# Altium footprint library Resistors_SMD_IPC-SM-782.PcbLib: 200 footprints (part 6 of 13)
Each footprint in its own frame and in the unit in brackets; x right, y up, seen from the top. Pads: shape width x height; smd on the part's side, far side on the other; paste and mask are expansions set on the pad; w line width, h text height; cw(c..) or ccw(c..) is an arc to the next point about the centre after c.
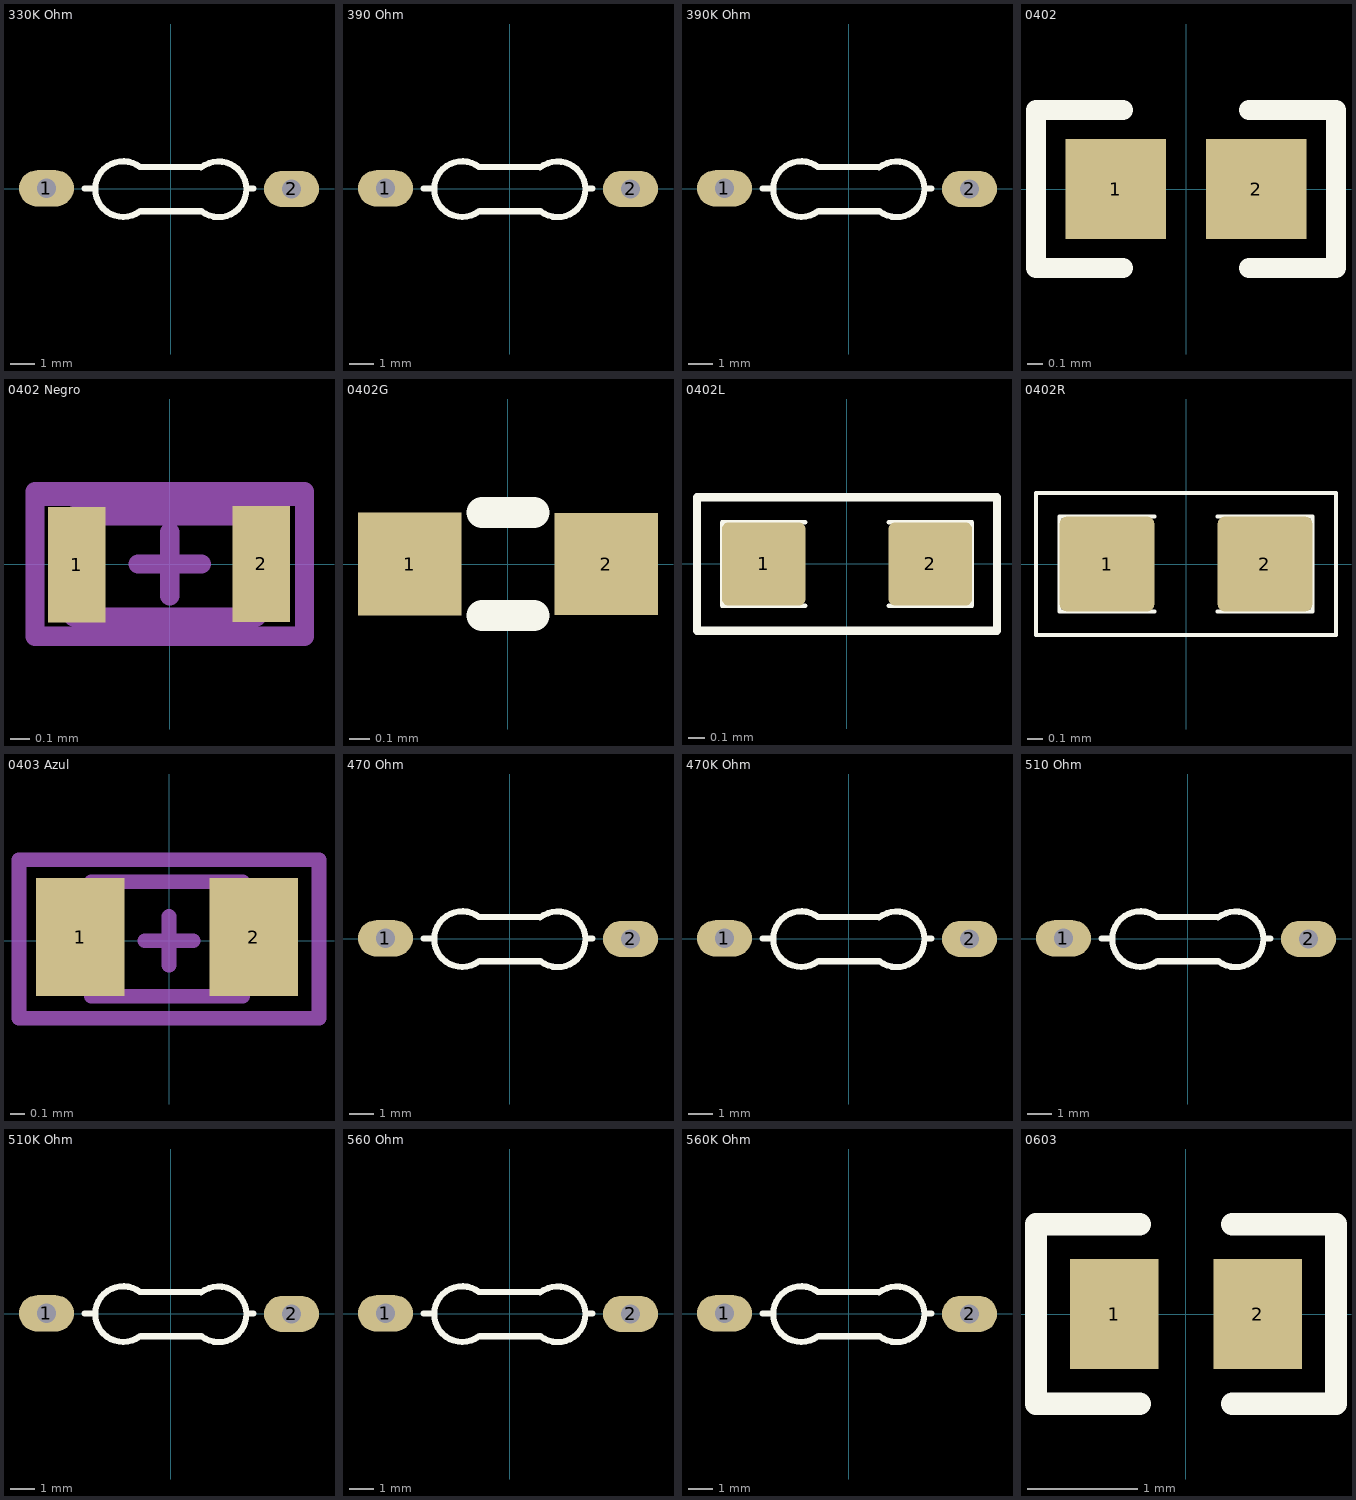
[diagram p5: the footprints below, top view; thin cyan lines are the x and y axes]

## 330K Ohm [mm] "RESISTENCIA DE 1/4 W DE 330K OHM"
pads (2):
  oval 2.27x1.5 hole 0.8: 1(-5.125,0.025) 2(5,0)
Top Overlay:
  lines w0.254: -3.55,0.025 -3.225,0.025 ; -1.269,-0.925 cw(c-1.959,-0.005) -1.25,0.9 ; -1.248,0.9 1.25,0.9 ; -1.245,-0.925 1.286,-0.925 ; 1.265,0.881 cw(c1.985,-0.015) 1.286,-0.928 ; 3.15,0.025 3.425,0.025
3D body "SW3dPS-RESISTOR, 0.25 W, 0.4 IN LEAD PITCH.STEP": height 1.16, standoff -1.16, extent -5.56,-2.349 5.21,3.125
3D body "Res 330K.STEP": height 2.93, standoff -0.91, extent -5.385,-1.168 5.385,1.143

## 390 Ohm [mm] "RESISTENCIA DE 1/4 W DE 390 OHM"
pads (2):
  oval 2.27x1.5 hole 0.8: 1(-5.125,0.025) 2(5,0)
Top Overlay:
  lines w0.254: -3.55,0.025 -3.225,0.025 ; -1.269,-0.925 cw(c-1.959,-0.005) -1.25,0.9 ; -1.248,0.9 1.25,0.9 ; -1.245,-0.925 1.286,-0.925 ; 1.265,0.881 cw(c1.985,-0.015) 1.286,-0.928 ; 3.15,0.025 3.425,0.025
3D body "SW3dPS-RESISTOR, 0.25 W, 0.4 IN LEAD PITCH.STEP": height 1.16, standoff -1.16, extent -5.56,-2.349 5.21,3.125
3D body "Res 390.STEP": height 2.93, standoff -0.91, extent -5.385,-1.168 5.385,1.143

## 390K Ohm [mm] "RESISTENCIA DE 1/4 W DE 390K OHM"
pads (2):
  oval 2.27x1.5 hole 0.8: 1(-5.125,0.025) 2(5,0)
Top Overlay:
  lines w0.254: -3.55,0.025 -3.225,0.025 ; -1.269,-0.925 cw(c-1.959,-0.005) -1.25,0.9 ; -1.248,0.9 1.25,0.9 ; -1.245,-0.925 1.286,-0.925 ; 1.265,0.881 cw(c1.985,-0.015) 1.286,-0.928 ; 3.15,0.025 3.425,0.025
3D body "SW3dPS-RESISTOR, 0.25 W, 0.4 IN LEAD PITCH.STEP": height 1.16, standoff -1.16, extent -5.56,-2.349 5.21,3.125
3D body "Res 390K.STEP": height 2.93, standoff -0.91, extent -5.385,-1.168 5.385,1.143

## 0402 [mil]
pads (2):
  rect 25x25 smd: 1(-17.5,0) 2(17.5,0)
Top Overlay:
  lines w5: -37.4,-19.68 -15.75,-19.68 ; -37.4,-18.7 -37.4,19.68 -15.75,19.68 ; 15.75,-19.68 37.4,-19.68 37.4,18.7 ; 15.75,19.68 37.4,19.68

## 0402 Negro [mm] "Chip Resistor, Empaque 0402"
height 0.3
pads (2):
  rect 0.3x0.6 smd: 1(-0.483,-0.004) 2(0.475,0)
Mechanical 13:
  lines w0.1: -0.5,-0.275 -0.5,0.25 0.45,0.25 0.45,-0.275 -0.5,-0.275
Mechanical 15:
  lines w0.1: -0.7,0.35 0.7,0.35 ; -0.165,0 0.165,0 ; 0,-0.165 0,0.165 ; -0.7,-0.375 -0.7,0.375 0.7,0.375 0.7,-0.375 -0.7,-0.375
3D body "0402 SMD Resistor.STEP": height 0.2, standoff 0, extent -0.508,-0.304 0.492,0.296

## 0402G [mil] "GEO case"
pads (2):
  rect 20x20 smd: 1(-19,0)
  rect 20x19.68 smd: 2(19,0)
Top Overlay:
  lines w6: -5,-10 5,-10 ; -5,10 5,10
3D body "User Library-CR1005-0402.step": height 13.78, standoff 0, extent -19.68,-9.85 19.68,9.84

## 0402L [mm]
pads (2):
  rrect15% 0.5x0.5 smd: 1(-0.5,0) 2(0.5,0)
Top Overlay:
  lines w0.025: -0.25,-0.25 -0.75,-0.25 -0.75,0.25 -0.25,0.25 ; 0.25,-0.25 0.75,-0.25 0.75,0.25 0.25,0.25
  lines w0.05: -0.9,-0.4 -0.9,0.4 0.9,0.4 0.9,-0.4 -0.9,-0.4
3D body "SW3dPS-d0402h025.STEP": height 0.25, standoff 0, extent -0.5,-0.25 0.5,0.25

## 0402R [mm]
pads (2):
  rrect15% 0.6x0.6 smd: 1(-0.5,0) 2(0.5,0)
Top Overlay:
  lines w0.025: -0.2,-0.3 -0.8,-0.3 -0.8,0.3 -0.2,0.3 ; 0.2,-0.3 0.8,-0.3 0.8,0.3 0.2,0.3 ; -0.95,-0.45 -0.95,0.45 0.95,0.45 0.95,-0.45 -0.95,-0.45
3D body "User Library-RES_1005-0402.STEP": height 0.41, standoff 0, extent -0.575,-0.275 0.575,0.275

## 0403 Azul [mm] "Chip Resistor, Empaque 0403"
height 0.3
pads (2):
  rect 0.6x0.8 smd: 1(-0.6,0.025) 2(0.575,0.025)
Mechanical 13:
  lines w0.1: -0.525,-0.375 -0.525,0.4 0.5,0.4 0.5,-0.375 -0.525,-0.375
Mechanical 15:
  lines w0.1: -0.165,0 0.165,0 ; 0,-0.165 0,0.165 ; -1.016,-0.525 -1.016,0.55 1.016,0.55 1.016,-0.525 -1.016,-0.525
3D body "0403.STEP": height 0.85, standoff -0.01, extent -0.525,-0.425 0.491,0.439
3D body "0403.STEP": height 0.73, standoff -0.13, extent -0.525,-0.407 0.491,0.457

## 470 Ohm [mm] "RESISTENCIA DE 1/4 W DE 470 OHM"
pads (2):
  oval 2.27x1.5 hole 0.8: 1(-5.125,0.025) 2(5,0)
Top Overlay:
  lines w0.254: -3.55,0.025 -3.225,0.025 ; -1.269,-0.925 cw(c-1.959,-0.005) -1.25,0.9 ; -1.248,0.9 1.25,0.9 ; -1.245,-0.925 1.286,-0.925 ; 1.265,0.881 cw(c1.985,-0.015) 1.286,-0.928 ; 3.15,0.025 3.425,0.025
3D body "SW3dPS-RESISTOR, 0.25 W, 0.4 IN LEAD PITCH.STEP": height 1.16, standoff -1.16, extent -5.56,-2.349 5.21,3.125
3D body "Res 470.STEP": height 2.93, standoff -0.91, extent -5.385,-1.168 5.385,1.143

## 470K Ohm [mm] "RESISTENCIA DE 1/4 W DE 470K OHM"
pads (2):
  oval 2.27x1.5 hole 0.8: 1(-5.125,0.025) 2(5,0)
Top Overlay:
  lines w0.254: -3.55,0.025 -3.225,0.025 ; -1.269,-0.925 cw(c-1.959,-0.005) -1.25,0.9 ; -1.248,0.9 1.25,0.9 ; -1.245,-0.925 1.286,-0.925 ; 1.265,0.881 cw(c1.985,-0.015) 1.286,-0.928 ; 3.15,0.025 3.425,0.025
3D body "Res 470K.STEP": height 2.93, standoff -0.91, extent -5.385,-1.168 5.385,1.143
3D body "SW3dPS-RESISTOR, 0.25 W, 0.4 IN LEAD PITCH.STEP": height 1.16, standoff -1.16, extent -5.56,-2.349 5.21,3.125

## 510 Ohm [mm] "RESISTENCIA DE 1/4 W DE 510 OHM"
pads (2):
  oval 2.27x1.5 hole 0.8: 1(-5.125,0.025) 2(5,0)
Top Overlay:
  lines w0.254: -3.55,0.025 -3.225,0.025 ; -1.269,-0.925 cw(c-1.959,-0.005) -1.25,0.9 ; -1.248,0.9 1.25,0.9 ; -1.245,-0.925 1.286,-0.925 ; 1.265,0.881 cw(c1.985,-0.015) 1.286,-0.928 ; 3.15,0.025 3.425,0.025
3D body "SW3dPS-RESISTOR, 0.25 W, 0.4 IN LEAD PITCH.STEP": height 1.16, standoff -1.16, extent -5.56,-2.349 5.21,3.125
3D body "Res 510.STEP": height 2.93, standoff -0.91, extent -5.385,-1.168 5.385,1.143

## 510K Ohm [mm] "RESISTENCIA DE 1/4 W DE 510K OHM"
pads (2):
  oval 2.27x1.5 hole 0.8: 1(-5.125,0.025) 2(5,0)
Top Overlay:
  lines w0.254: -3.55,0.025 -3.225,0.025 ; -1.269,-0.925 cw(c-1.959,-0.005) -1.25,0.9 ; -1.248,0.9 1.25,0.9 ; -1.245,-0.925 1.286,-0.925 ; 1.265,0.881 cw(c1.985,-0.015) 1.286,-0.928 ; 3.15,0.025 3.425,0.025
3D body "Res 510K.STEP": height 2.93, standoff -0.91, extent -5.385,-1.168 5.385,1.143
3D body "SW3dPS-RESISTOR, 0.25 W, 0.4 IN LEAD PITCH.STEP": height 1.16, standoff -1.16, extent -5.56,-2.349 5.21,3.125

## 560 Ohm [mm] "RESISTENCIA DE 1/4 W DE 560K OHM"
pads (2):
  oval 2.27x1.5 hole 0.8: 1(-5.125,0.025) 2(5,0)
Top Overlay:
  lines w0.254: -3.55,0.025 -3.225,0.025 ; -1.269,-0.925 cw(c-1.959,-0.005) -1.25,0.9 ; -1.248,0.9 1.25,0.9 ; -1.245,-0.925 1.286,-0.925 ; 1.265,0.881 cw(c1.985,-0.015) 1.286,-0.928 ; 3.15,0.025 3.425,0.025
3D body "SW3dPS-RESISTOR, 0.25 W, 0.4 IN LEAD PITCH.STEP": height 1.16, standoff -1.16, extent -5.56,-2.349 5.21,3.125
3D body "Res 560.STEP": height 2.93, standoff -0.91, extent -5.385,-1.168 5.385,1.143

## 560K Ohm [mm] "RESISTENCIA DE 1/4 W DE 560K OHM"
pads (2):
  oval 2.27x1.5 hole 0.8: 1(-5.125,0.025) 2(5,0)
Top Overlay:
  lines w0.254: -3.55,0.025 -3.225,0.025 ; -1.269,-0.925 cw(c-1.959,-0.005) -1.25,0.9 ; -1.248,0.9 1.25,0.9 ; -1.245,-0.925 1.286,-0.925 ; 1.265,0.881 cw(c1.985,-0.015) 1.286,-0.928 ; 3.15,0.025 3.425,0.025
3D body "SW3dPS-RESISTOR, 0.25 W, 0.4 IN LEAD PITCH.STEP": height 1.16, standoff -1.16, extent -5.56,-2.349 5.21,3.125
3D body "Res 560K.STEP": height 2.93, standoff -0.91, extent -5.385,-1.168 5.385,1.143

## 0603 [mm]
pads (2):
  rect 0.8x1 smd: 1(-0.649,0) 2(0.649,0)
Top Overlay:
  lines w0.203: -0.418,-0.813 -1.358,-0.813 -1.358,0.813 -0.418,0.813 ; 0.418,-0.813 1.358,-0.813 1.358,0.813 0.418,0.813
3D body "SW3dPS-R0603.step": height 0.37, standoff 0, extent -0.8,-0.406 0.8,0.396